# Altium footprint library YQPOWER.PcbLib: 215 footprints (part 7 of 14)
Each footprint in its own frame and in the unit in brackets; x right, y up, seen from the top. Pads: shape width x height; smd on the part's side, far side on the other; paste and mask are expansions set on the pad; w line width, h text height; cw(c..) or ccw(c..) is an arc to the next point about the centre after c.
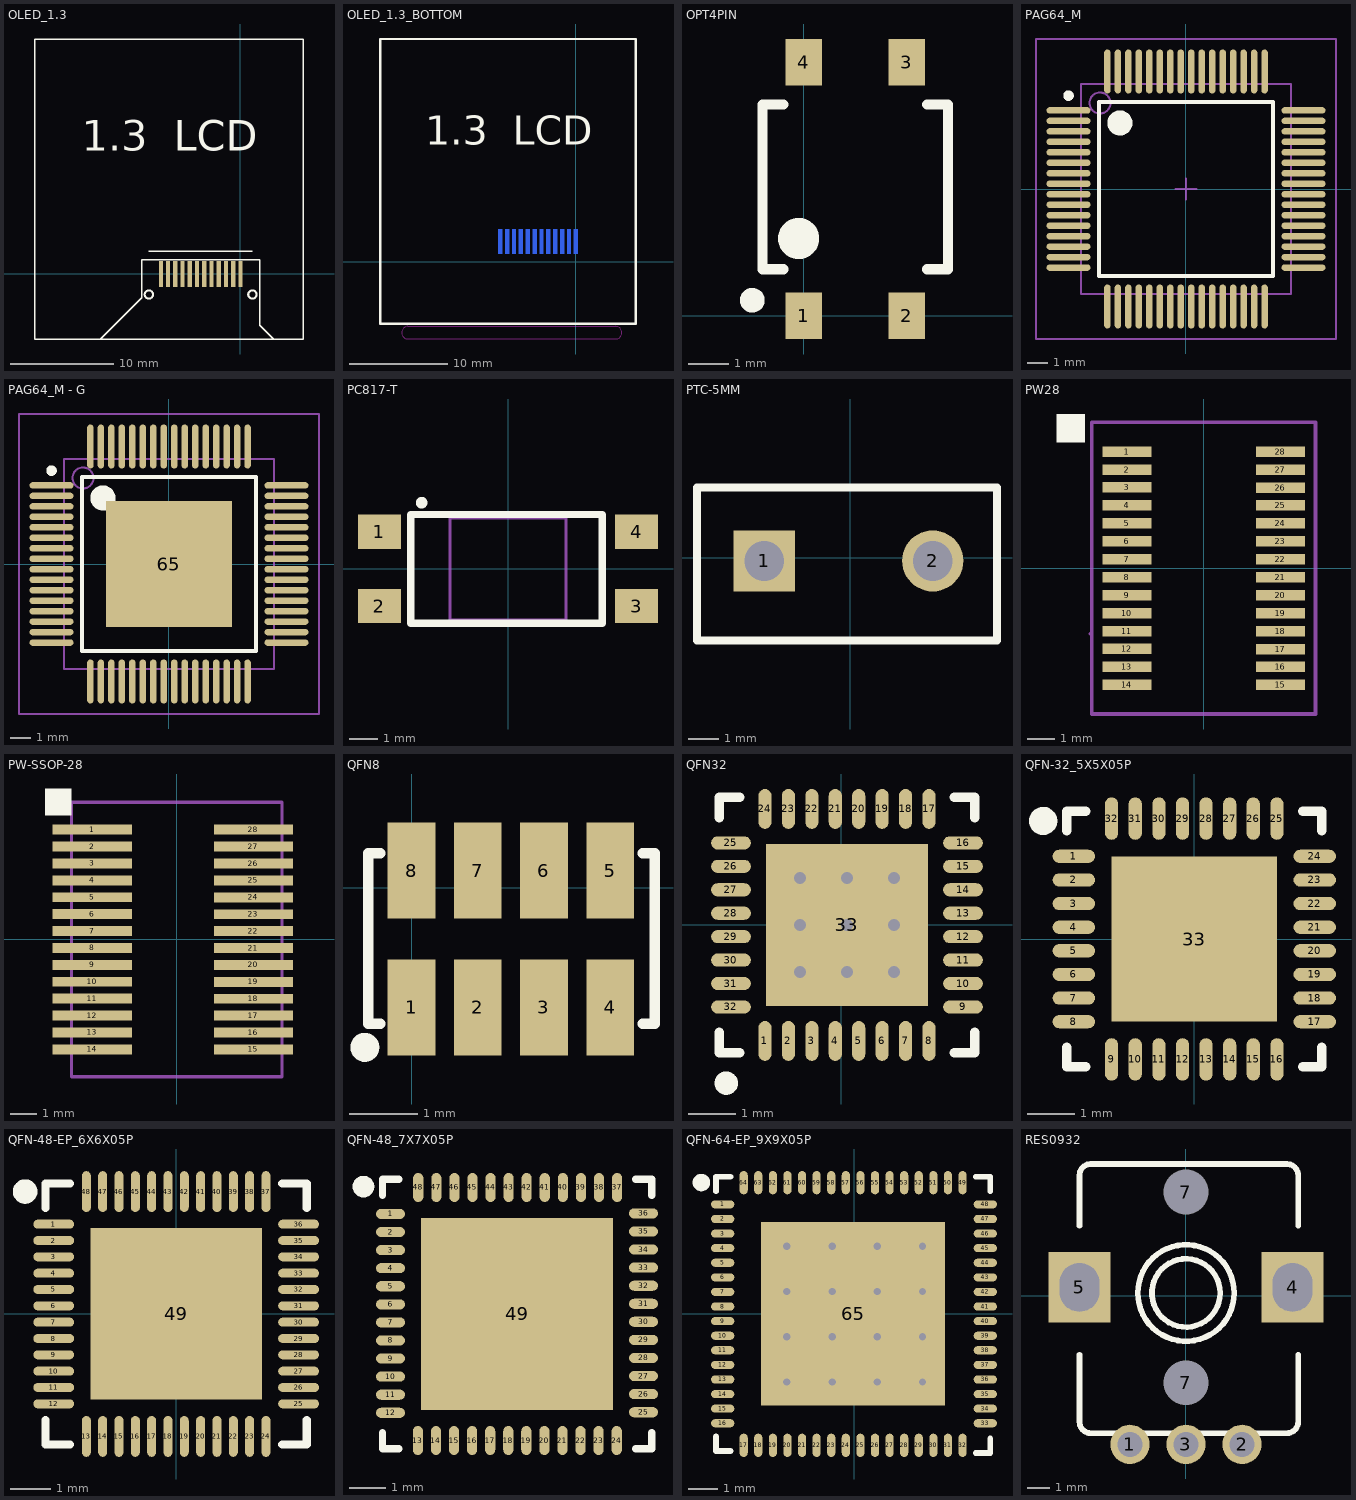
[diagram p6: the footprints below, top view; thin cyan lines are the x and y axes]

## OLED_1.3 [mm]
pads (12):
  rect 0.4x2.5 smd: 1(0,0) 2(-0.7,0) 3(-1.4,0) 4(-2.1,0) 5(-2.8,0) 6(-3.5,0) 7(-4.2,0) 8(-4.9,0) 9(-5.6,0) 10(-6.3,0) 11(-7,0) 12(-7.7,0)
Top Overlay:
  circle w0.2: c-8.86,-2 r0.4
  circle w0.2: c1.15,-2 r0.4
  lines w0.127: -13.55,-6.3 -9.55,-2.3 -9.55,1.38 1.85,1.38 1.85,-4.96 3.17,-6.28 ; -8.85,2.19 1.15,2.19 ; -19.91,-6.3 6.09,-6.3 6.09,22.7 -19.91,22.7 -19.91,-6.3
  text "1.3  LCD" at -15.36,10.94 h5

## OLED_1.3_BOTTOM [mm]
pads (12):
  rect 0.4x2.5 smd far side: 1(0,2.07) 2(-0.7,2.07) 3(-1.4,2.07) 4(-2.1,2.07) 5(-2.8,2.07) 6(-3.5,2.07) 7(-4.2,2.07) 8(-4.9,2.07) 9(-5.6,2.07) 10(-6.3,2.07) 11(-7,2.07) 12(-7.7,2.07)
Top Overlay:
  lines w0.254: -19.91,-6.3 6.09,-6.3 6.09,22.7 -19.91,22.7 -19.91,-6.3
  text "1.3  LCD" at -15.36,10.94 h5
Bottom Overlay:
  circle w0.2: c-8.86,-2.1 r0.4
  circle w0.2: c1.15,-2.1 r0.4
  lines w0.254: -15.065,-7.815 -9.55,-2.3 -9.55,1.96 1.85,1.96 1.85,-4.96 4.71,-7.82 -15.05,-7.82 ; -8.8,1.95 1.2,1.95
  text "12" at -8.35,2.15 h2.54
  text "1" at 1.46,2.16 h2.54
Keep-Out Layer:
  lines w0.127: -17.101,-6.567 4.099,-6.567 ; -17.101,-6.557 ccw(c-17.105,-7.197) -17.101,-7.837 4.049,-7.837 ; 4.049,-7.847 ccw(c4.053,-7.207) 4.049,-6.567

## OPT4PIN [mm] "光继电器"
pads (4):
  rect 0.9x1.15 smd: 1(0,0) 2(2.54,0) 3(2.54,6.25) 4(0,6.25)
Top Overlay:
  circle w0.305: c-1.27,0.381 r0.152
  circle w0.508: c-0.127,1.905 r0.254
  lines w0.127: -1.016,1.143 -1.016,5.207
  lines w0.254: -0.508,1.143 -1.016,1.143 -1.016,5.207 -0.508,5.207 ; 3.048,1.143 3.556,1.143 3.556,5.207 3.048,5.207

## PAG64_M [mm] "64-Pin Thin Quad Flat Pack 0.5 mm Pitch, IPC Low Density"
height 1.2
pads (64):
  oval 2.1x0.3 smd: 1(-5.6,3.75) 2(-5.6,3.25) 3(-5.6,2.75) 4(-5.6,2.25) 5(-5.6,1.75) 6(-5.6,1.25) 7(-5.6,0.75) 8(-5.6,0.25) 9(-5.6,-0.25) 10(-5.6,-0.75) 11(-5.6,-1.25) 12(-5.6,-1.75) 13(-5.6,-2.25) 14(-5.6,-2.75) 15(-5.6,-3.25) 16(-5.6,-3.75) 33(5.6,-3.75) 34(5.6,-3.25) 35(5.6,-2.75) 36(5.6,-2.25) 37(5.6,-1.75) 38(5.6,-1.25) 39(5.6,-0.75) 40(5.6,-0.25) 41(5.6,0.25) 42(5.6,0.75) 43(5.6,1.25) 44(5.6,1.75) 45(5.6,2.25) 46(5.6,2.75) 47(5.6,3.25) 48(5.6,3.75)
  oval 0.3x2.1 smd: 17(-3.75,-5.6) 18(-3.25,-5.6) 19(-2.75,-5.6) 20(-2.25,-5.6) 21(-1.75,-5.6) 22(-1.25,-5.6) 23(-0.75,-5.6) 24(-0.25,-5.6) 25(0.25,-5.6) 26(0.75,-5.6) 27(1.25,-5.6) 28(1.75,-5.6) 29(2.25,-5.6) 30(2.75,-5.6) 31(3.25,-5.6) 32(3.75,-5.6) 49(3.75,5.6) 50(3.25,5.6) 51(2.75,5.6) 52(2.25,5.6) 53(1.75,5.6) 54(1.25,5.6) 55(0.75,5.6) 56(0.25,5.6) 57(-0.25,5.6) 58(-0.75,5.6) 59(-1.25,5.6) 60(-1.75,5.6) 61(-2.25,5.6) 62(-2.75,5.6) 63(-3.25,5.6) 64(-3.75,5.6)
Top Overlay:
  circle w0.6: c-3.15,3.15 r0.3
  circle w0.25: c-5.6,4.45 r0.125
  lines w0.2: -4.15,-4.15 4.15,-4.15 4.15,4.15 -4.15,4.15 -4.15,-4.15
Mechanical 13:
  circle w0.1: c-4.1,4.1 r0.5
  lines w0.1: -5,-5 5,-5 5,5 -5,5 -5,-5
Mechanical 15:
  lines w0.1: -0.5,0 0.5,0 ; 0,-0.5 0,0.5 ; -7.15,-7.15 7.15,-7.15 7.15,7.15 -7.15,7.15 -7.15,-7.15
3D body: height 1.2, standoff 0, extent -5,-5 5,5

## PAG64_M - G [mm] "64-Pin Thin Quad Flat Pack 0.5 mm Pitch, IPC Low Density"
height 1.2
pads (65):
  oval 2.1x0.3 smd: 1(-5.6,3.75) 2(-5.6,3.25) 3(-5.6,2.75) 4(-5.6,2.25) 5(-5.6,1.75) 6(-5.6,1.25) 7(-5.6,0.75) 8(-5.6,0.25) 9(-5.6,-0.25) 10(-5.6,-0.75) 11(-5.6,-1.25) 12(-5.6,-1.75) 13(-5.6,-2.25) 14(-5.6,-2.75) 15(-5.6,-3.25) 16(-5.6,-3.75) 33(5.6,-3.75) 34(5.6,-3.25) 35(5.6,-2.75) 36(5.6,-2.25) 37(5.6,-1.75) 38(5.6,-1.25) 39(5.6,-0.75) 40(5.6,-0.25) 41(5.6,0.25) 42(5.6,0.75) 43(5.6,1.25) 44(5.6,1.75) 45(5.6,2.25) 46(5.6,2.75) 47(5.6,3.25) 48(5.6,3.75)
  oval 0.3x2.1 smd: 17(-3.75,-5.6) 18(-3.25,-5.6) 19(-2.75,-5.6) 20(-2.25,-5.6) 21(-1.75,-5.6) 22(-1.25,-5.6) 23(-0.75,-5.6) 24(-0.25,-5.6) 25(0.25,-5.6) 26(0.75,-5.6) 27(1.25,-5.6) 28(1.75,-5.6) 29(2.25,-5.6) 30(2.75,-5.6) 31(3.25,-5.6) 32(3.75,-5.6) 49(3.75,5.6) 50(3.25,5.6) 51(2.75,5.6) 52(2.25,5.6) 53(1.75,5.6) 54(1.25,5.6) 55(0.75,5.6) 56(0.25,5.6) 57(-0.25,5.6) 58(-0.75,5.6) 59(-1.25,5.6) 60(-1.75,5.6) 61(-2.25,5.6) 62(-2.75,5.6) 63(-3.25,5.6) 64(-3.75,5.6)
  rect 6x6 smd: 65(0,0)
Top Overlay:
  circle w0.6: c-3.15,3.15 r0.3
  circle w0.25: c-5.6,4.45 r0.125
  lines w0.2: -4.15,-4.15 4.15,-4.15 4.15,4.15 -4.15,4.15 -4.15,-4.15
Mechanical 13:
  circle w0.1: c-4.1,4.1 r0.5
  lines w0.1: -5,-5 5,-5 5,5 -5,5 -5,-5
Mechanical 15:
  lines w0.1: -0.5,0 0.5,0 ; 0,-0.5 0,0.5 ; -7.15,-7.15 7.15,-7.15 7.15,7.15 -7.15,7.15 -7.15,-7.15
3D body: height 1.2, standoff 0, extent -5,-5 5,5

## PC817-T [mm] "Fairchild OptoCoupler"
height 2.4
pads (4):
  rect 1.5x1.2 smd: 1(-4.5,1.3) 2(-4.5,-1.3) 3(4.5,-1.3) 4(4.5,1.3)
Top Overlay:
  circle w0.254: c-3.022,2.316 r0.077
  lines w0.254: -3.4,-1.9 -3.4,1.9 3.3,1.9 3.3,-1.9 -3.4,-1.9
Mechanical 5:
  lines w0.102: -2.032,-1.778 -2.032,1.778 2.032,1.778 2.032,-1.778 -2.032,-1.778
  text ".Designator" at -1.7,-0.525 h1.02
3D body: height 2.4, standoff 0, extent -2.299,-2.024 2.299,2.024

## PTC-5MM [mm]
pads (2):
  rect 2x2 hole 1.3: 1(-2.8,-0.1)
  round 2 hole 1.3: 2(2.7,-0.1)
Top Overlay:
  lines w0.254: -5,-2.7 -5,2.3 4.8,2.3 4.8,-2.7 -5,-2.7

## PW28 [mil]
height 100
pads (28):
  rect 70x15 smd: 1(-109.5,166.4) 2(-109.5,140.8) 3(-109.5,115.2) 4(-109.5,89.6) 5(-109.5,64) 6(-109.5,38.4) 7(-109.5,12.8) 8(-109.5,-12.8) 9(-109.5,-38.4) 10(-109.5,-64) 11(-109.5,-89.6) 12(-109.5,-115.2) 13(-109.5,-140.8) 14(-109.5,-166.4) 15(109.5,-166.5) 16(109.5,-140.9) 17(109.5,-115.3) 18(109.5,-89.7) 19(109.5,-64.1) 20(109.5,-38.5) 21(109.5,-12.9) 22(109.5,12.7) 23(109.5,38.3) 24(109.5,63.9) 25(109.5,89.5) 26(109.5,115.1) 27(109.5,140.7) 28(109.5,166.4)
Top Overlay:
  region: -210,180 -170,180 -170,220 -210,220
Mechanical 5:
  lines w5: -161.8,-93.2 -161.7,-93.2 ; -159.5,-208 -159.5,208 159.5,208 159.5,-208 -159.5,-208
  text "*" at -65.8,126.9 h30
  text ".Designator" at -75,-20 h40

## PW-SSOP-28 [mil]
height 100
pads (28):
  rect 120x15 smd: 1(-128,166.4) 2(-128,140.8) 3(-128,115.2) 4(-128,89.6) 5(-128,64) 6(-128,38.4) 7(-128,12.8) 8(-128,-12.8) 9(-128,-38.4) 10(-128,-64) 11(-128,-89.6) 12(-128,-115.2) 13(-128,-140.8) 14(-128,-166.4) 15(116.14,-166.54) 16(116.14,-140.94) 17(116.14,-115.34) 18(116.14,-89.74) 19(116.14,-64.14) 20(116.14,-38.54) 21(116.14,-12.94) 22(116.14,12.66) 23(116.14,38.26) 24(116.14,63.86) 25(116.14,89.46) 26(116.14,115.06) 27(116.14,140.66) 28(116.14,166.36)
Top Overlay:
  region: -199.5,188 -159.5,188 -159.5,228 -199.5,228
Mechanical 5:
  lines w5: -180.3,-93.2 -180.2,-93.2 ; -159.5,-208 159.5,-208 159.5,208 -159.5,208 -159.5,-208
  text ".Designator" at -75,-20 h40
  text "*" at -84.3,126.9 h30

## QFN8 [mm]
height 0.6
pads (8):
  rect 0.7x1.4 smd: 1(0,-1.753) 2(0.97,-1.753) 3(1.94,-1.753) 4(2.91,-1.753) 5(2.91,0.253) 6(1.94,0.253) 7(0.97,0.253) 8(0,0.253)
Top Overlay:
  circle w0.224: c-0.684,-2.337 r0.1
  lines w0.152: -0.457,-1.992 -0.635,-1.992 -0.635,0.508 -0.457,0.508 ; 3.387,-1.992 3.565,-1.992 3.565,0.508 3.387,0.508

## QFN32 [mm]
pads (33):
  oval 0.28x0.85 smd paste-0.025 mask+0.07: 1(-1.623,-2.475) 2(-1.123,-2.475) 3(-0.623,-2.475) 4(-0.123,-2.475) 5(0.377,-2.475) 6(0.877,-2.475) 7(1.377,-2.475) 8(1.877,-2.475) 17(1.877,2.475) 18(1.377,2.475) 19(0.877,2.475) 20(0.377,2.475) 21(-0.123,2.475) 22(-0.623,2.475) 23(-1.123,2.475) 24(-1.623,2.475)
  oval 0.85x0.28 smd paste-0.025 mask+0.07: 9(2.602,-1.75) 10(2.602,-1.25) 11(2.602,-0.75) 12(2.602,-0.25) 13(2.602,0.25) 14(2.602,0.75) 15(2.602,1.25) 16(2.602,1.75) 25(-2.348,1.75) 26(-2.348,1.25) 27(-2.348,0.75) 28(-2.348,0.25) 29(-2.348,-0.25) 30(-2.348,-0.75) 31(-2.348,-1.25) 32(-2.348,-1.75)
  rect 3.45x3.45 smd paste-1.725 mask+0.07: 33(0.127,0)
via 1.127,1 diameter 0.508 hole 0.254
via 1.127,0 diameter 0.508 hole 0.254
via 1.127,-1 diameter 0.508 hole 0.254
via 0.127,1 diameter 0.508 hole 0.254
via 0.127,0 diameter 0.508 hole 0.254
via 0.127,-1 diameter 0.508 hole 0.254
via -0.873,1 diameter 0.508 hole 0.254
via -0.873,0 diameter 0.508 hole 0.254
via -0.873,-1 diameter 0.508 hole 0.254
Top Overlay:
  circle w0.25: c-2.448,-3.375 r0.125
  lines w0.2: -2.598,-2.29 -2.598,-2.725 -2.163,-2.725 ; -2.598,2.29 -2.598,2.725 -2.163,2.725 ; 2.417,-2.725 2.852,-2.725 2.852,-2.29 ; 2.417,2.725 2.852,2.725 2.852,2.29

## QFN-32_5X5X05P [mm]
pads (33):
  oval 0.9x0.28 smd: 1(-2.55,1.75) 2(-2.55,1.25) 3(-2.55,0.749) 4(-2.55,0.249) 5(-2.55,-0.249) 6(-2.55,-0.749) 7(-2.55,-1.25) 8(-2.55,-1.75) 17(2.55,-1.75) 18(2.55,-1.25) 19(2.55,-0.749) 20(2.55,-0.249) 21(2.55,0.249) 22(2.55,0.749) 23(2.55,1.25) 24(2.55,1.75)
  oval 0.28x0.9 smd: 9(-1.75,-2.55) 10(-1.25,-2.55) 11(-0.749,-2.55) 12(-0.249,-2.55) 13(0.249,-2.55) 14(0.749,-2.55) 15(1.25,-2.55) 16(1.75,-2.55) 25(1.75,2.55) 26(1.25,2.55) 27(0.749,2.55) 28(0.249,2.55) 29(-0.249,2.55) 30(-0.749,2.55) 31(-1.25,2.55) 32(-1.75,2.55)
  rect 3.5x3.5 smd: 33(0,0)
Top Overlay:
  lines w0.2: -2.7,-2.295 -2.7,-2.7 -2.295,-2.7 ; -2.7,2.295 -2.7,2.7 -2.295,2.7 ; 2.295,-2.7 2.7,-2.7 2.7,-2.295 ; 2.295,2.7 2.7,2.7 2.7,2.295
  lines w0.3: -3.051,2.497 cw(c-3.201,2.498) -3.051,2.499
Top Paste:
  region: -0.25,-0.25 -0.25,0.25 0.25,0.25 0.25,-0.25
  region: -0.25,-1.05 -0.25,-0.55 0.25,-0.55 0.25,-1.05
  region: -1.05,-0.25 -1.05,0.25 -0.55,0.25 -0.55,-0.25
  region: -1.05,-1.05 -1.05,-0.55 -0.55,-0.55 -0.55,-1.05
  region: -1.05,0.55 -1.05,1.05 -0.55,1.05 -0.55,0.55
  region: -0.25,0.55 -0.25,1.05 0.25,1.05 0.25,0.55
  region: 0.55,0.55 0.55,1.05 1.05,1.05 1.05,0.55
  region: 0.55,-0.25 0.55,0.25 1.05,0.25 1.05,-0.25
  region: 0.55,-1.05 0.55,-0.55 1.05,-0.55 1.05,-1.05
Mechanical 15:
  lines w0.003: -0.201,-0.025 -0.15,0.025

## QFN-48-EP_6X6X05P [mm]
pads (49):
  oval 1x0.22 smd: 1(-3.001,2.2) 2(-3.001,1.798) 3(-3.001,1.4) 4(-3.001,0.998) 5(-3.001,0.599) 6(-3.001,0.198) 7(-3.001,-0.201) 8(-3.001,-0.602) 9(-3.001,-1.001) 10(-3.001,-1.402) 11(-3.001,-1.801) 12(-3.001,-2.202) 25(2.999,-2.202) 26(2.999,-1.801) 27(2.999,-1.402) 28(2.999,-1.001) 29(2.999,-0.602) 30(2.999,-0.201) 31(2.999,0.198) 32(2.999,0.599) 33(2.999,0.998) 34(2.999,1.4) 35(2.999,1.798) 36(2.999,2.2)
  oval 0.22x1 smd: 13(-2.2,-3.001) 14(-1.801,-3.001) 15(-1.402,-3.001) 16(-1.001,-3.001) 17(-0.602,-3.001) 18(-0.201,-3.001) 19(0.198,-3.001) 20(0.599,-3.001) 21(0.998,-3.001) 22(1.4,-3.001) 23(1.798,-3.001) 24(2.2,-3.001) 37(2.2,2.999) 38(1.798,2.999) 39(1.4,2.999) 40(0.998,2.999) 41(0.599,2.999) 42(0.198,2.999) 43(-0.201,2.999) 44(-0.602,2.999) 45(-1.001,2.999) 46(-1.402,2.999) 47(-1.801,2.999) 48(-2.2,2.999)
  rect 4.2x4.2 smd: 49(0,0)
Top Overlay:
  lines w0.2: -3.201,-2.601 -3.201,-3.201 -2.601,-3.201 ; -3.201,2.599 -3.201,3.199 -2.601,3.199 ; 2.599,-3.201 3.199,-3.201 3.199,-2.601 ; 2.599,3.199 3.199,3.199 3.199,2.599
  lines w0.3: -3.551,2.997 cw(c-3.701,2.998) -3.551,3

## QFN-48_7X7X05P [mm]
pads (49):
  oval 0.8x0.28 smd: 1(-1191.387,-1176.985) 2(-1191.387,-1177.485) 3(-1191.387,-1177.986) 4(-1191.387,-1178.486) 5(-1191.387,-1178.987) 6(-1191.387,-1179.487) 7(-1191.387,-1179.985) 8(-1191.387,-1180.485) 9(-1191.387,-1180.985) 10(-1191.387,-1181.486) 11(-1191.387,-1181.986) 12(-1191.387,-1182.487) 25(-1184.387,-1182.471) 26(-1184.387,-1181.971) 27(-1184.387,-1181.471) 28(-1184.387,-1180.97) 29(-1184.387,-1180.47) 30(-1184.387,-1179.969) 31(-1184.387,-1179.472) 32(-1184.387,-1178.971) 33(-1184.387,-1178.471) 34(-1184.387,-1177.971) 35(-1184.387,-1177.47) 36(-1184.387,-1176.97)
  oval 0.28x0.8 smd: 13(-1190.63,-1183.254) 14(-1190.13,-1183.254) 15(-1189.63,-1183.254) 16(-1189.129,-1183.254) 17(-1188.629,-1183.254) 18(-1188.128,-1183.254) 19(-1187.631,-1183.254) 20(-1187.13,-1183.254) 21(-1186.63,-1183.254) 22(-1186.129,-1183.254) 23(-1185.629,-1183.254) 24(-1185.129,-1183.254) 37(-1185.119,-1176.254) 38(-1185.619,-1176.254) 39(-1186.119,-1176.254) 40(-1186.62,-1176.254) 41(-1187.12,-1176.254) 42(-1187.62,-1176.254) 43(-1188.118,-1176.254) 44(-1188.619,-1176.254) 45(-1189.119,-1176.254) 46(-1189.619,-1176.254) 47(-1190.12,-1176.254) 48(-1190.62,-1176.254)
  rect 5.3x5.3 smd: 49(-1187.887,-1179.754)
Top Overlay:
  lines w0.2: -1191.612,-1183.029 -1191.612,-1183.479 -1191.162,-1183.479 ; -1191.612,-1176.479 -1191.612,-1176.029 -1191.162,-1176.029 ; -1184.612,-1183.479 -1184.162,-1183.479 -1184.162,-1183.029 ; -1184.612,-1176.029 -1184.162,-1176.029 -1184.162,-1176.479
  lines w0.3: -1191.987,-1176.231 cw(c-1192.137,-1176.229) -1191.987,-1176.228

## QFN-64-EP_9X9X05P [mm]
pads (65):
  oval 0.8x0.28 smd: 1(-4.5,3.756) 2(-4.5,3.256) 3(-4.5,2.756) 4(-4.5,2.256) 5(-4.5,1.756) 6(-4.5,1.256) 7(-4.5,0.756) 8(-4.5,0.256) 9(-4.5,-0.244) 10(-4.5,-0.744) 11(-4.5,-1.244) 12(-4.5,-1.744) 13(-4.5,-2.244) 14(-4.5,-2.744) 15(-4.5,-3.244) 16(-4.5,-3.744) 33(4.5,-3.744) 34(4.5,-3.244) 35(4.5,-2.744) 36(4.5,-2.244) 37(4.5,-1.744) 38(4.5,-1.244) 39(4.5,-0.744) 40(4.5,-0.244) 41(4.5,0.256) 42(4.5,0.756) 43(4.5,1.256) 44(4.5,1.756) 45(4.5,2.256) 46(4.5,2.756) 47(4.5,3.256) 48(4.5,3.756)
  oval 0.28x0.8 smd: 17(-3.781,-4.5) 18(-3.28,-4.5) 19(-2.781,-4.5) 20(-2.28,-4.5) 21(-1.781,-4.5) 22(-1.28,-4.5) 23(-0.781,-4.5) 24(-0.28,-4.5) 25(0.219,-4.5) 26(0.72,-4.5) 27(1.219,-4.5) 28(1.72,-4.5) 29(2.219,-4.5) 30(2.72,-4.5) 31(3.219,-4.5) 32(3.72,-4.5) 49(3.72,4.5) 50(3.219,4.5) 51(2.72,4.5) 52(2.219,4.5) 53(1.72,4.5) 54(1.219,4.5) 55(0.72,4.5) 56(0.219,4.5) 57(-0.28,4.5) 58(-0.781,4.5) 59(-1.28,4.5) 60(-1.781,4.5) 61(-2.28,4.5) 62(-2.781,4.5) 63(-3.28,4.5) 64(-3.781,4.5)
  rect 6.3x6.3 smd: 65(-0.03,0.006)
via -2.3,2.32 diameter 0.5 hole 0.25
via 2.35,-2.33 diameter 0.5 hole 0.25
via 0.8,-2.33 diameter 0.5 hole 0.25
via -0.75,-2.33 diameter 0.5 hole 0.25
via -2.3,-2.33 diameter 0.5 hole 0.25
via -2.3,-0.78 diameter 0.5 hole 0.25
via -0.75,-0.78 diameter 0.5 hole 0.25
via 0.8,-0.78 diameter 0.5 hole 0.25
via 2.35,-0.78 diameter 0.5 hole 0.25
via 2.35,0.77 diameter 0.5 hole 0.25
via 0.8,0.77 diameter 0.5 hole 0.25
via -0.75,0.77 diameter 0.5 hole 0.25
via -2.3,0.77 diameter 0.5 hole 0.25
via 2.35,2.32 diameter 0.5 hole 0.25
via 0.8,2.32 diameter 0.5 hole 0.25
via -0.75,2.32 diameter 0.5 hole 0.25
Top Overlay:
  lines w0.2: -4.73,-4.195 -4.73,-4.693 -4.232,-4.693 ; -4.73,4.207 -4.73,4.705 -4.232,4.705 ; 4.171,-4.76 4.668,-4.76 4.668,-4.262 ; 4.171,4.705 4.668,4.705 4.668,4.207
  lines w0.3: -5.08,4.504 cw(c-5.23,4.506) -5.08,4.507

## RES0932 [mil]
height 500
pads (7):
  round 70 hole 45: 1(-100,-265) 2(100,-265) 3(0,-265)
  rect 110.24x125.98 hole 70.87 slot 86.61 at 90 deg: 4(190,15) 5(-190,15)
  round 60 hole 80: 7(0,-155) 7(0,185)
Top Overlay:
  circle w10: c0,5 r86.02
  circle w10: c0,5 r60.83
  lines w10: -190,-105 -190,-225 ccw(c-170,-225) -170,-245 180,-245 ccw(c180,-225) 200,-225 200,-105 ; -190,125 -190,215 cw(c-170,215) -170,235 180,235 cw(c180,215) 200,215 200,125